# Altium footprint library Connectors.PcbLib: 268 footprints (part 4 of 21) (continued)
## CN_VME64_160pin [mm] "160pin 2.54mm Pitch VME64 compatible DIN41612" (continued)
3D body: height 6.84, standoff 6.24, extent 37.8,-8.5 38.4,7.92
3D body: height 6.84, standoff -3, extent 37.8,7.32 38.4,7.92
3D body: height 9.42, standoff 8.94, extent 37.8,-8 38.4,-2.95
3D body: height 8.94, standoff 8.34, extent 37.8,-2.95 38.4,10.46
3D body: height 8.94, standoff -3, extent 37.8,9.86 38.4,10.46
3D body: height 4.3, standoff -3, extent 37.8,4.78 38.4,5.38
3D body: height 4.3, standoff 3.7, extent 37.8,-8.5 38.4,5.38
3D body: height 0, standoff -3, extent 40.34,-0.3 40.94,0.3
3D body: height 1.76, standoff 1.16, extent 40.34,-8.5 40.94,2.84
3D body: height 1.76, standoff -3, extent 40.34,2.24 40.94,2.84
3D body: height 6.84, standoff 6.24, extent 40.34,-8.5 40.94,7.92
3D body: height 6.84, standoff -3, extent 40.34,7.32 40.94,7.92
3D body: height 9.42, standoff 8.94, extent 40.34,-8 40.94,-2.95
3D body: height 8.94, standoff 8.34, extent 40.34,-2.95 40.94,10.46
3D body: height 8.94, standoff -3, extent 40.34,9.86 40.94,10.46
3D body: height 4.3, standoff -3, extent 40.34,4.78 40.94,5.38
3D body: height 4.3, standoff 3.7, extent 40.34,-8.5 40.94,5.38
3D body: height 0, standoff -3, extent 42.88,-0.3 43.48,0.3
3D body: height 1.76, standoff 1.16, extent 42.88,-8.5 43.48,2.84
3D body: height 1.76, standoff -3, extent 42.88,2.24 43.48,2.84
3D body: height 6.84, standoff 6.24, extent 42.88,-8.5 43.48,7.92
3D body: height 6.84, standoff -3, extent 42.88,7.32 43.48,7.92
3D body: height 9.42, standoff 8.94, extent 42.88,-8 43.48,-2.95
3D body: height 8.94, standoff 8.34, extent 42.88,-2.95 43.48,10.46
3D body: height 8.94, standoff -3, extent 42.88,9.86 43.48,10.46
3D body: height 4.3, standoff -3, extent 42.88,4.78 43.48,5.38
3D body: height 4.3, standoff 3.7, extent 42.88,-8.5 43.48,5.38
3D body: height 0, standoff -3, extent 45.42,-0.3 46.02,0.3
3D body: height 1.76, standoff 1.16, extent 45.42,-8.5 46.02,2.84
3D body: height 1.76, standoff -3, extent 45.42,2.24 46.02,2.84
3D body: height 6.84, standoff 6.24, extent 45.42,-8.5 46.02,7.92
3D body: height 6.84, standoff -3, extent 45.42,7.32 46.02,7.92
3D body: height 9.42, standoff 8.94, extent 45.42,-8 46.02,-2.95
3D body: height 8.94, standoff 8.34, extent 45.42,-2.95 46.02,10.46
3D body: height 8.94, standoff -3, extent 45.42,9.86 46.02,10.46
3D body: height 4.3, standoff -3, extent 45.42,4.78 46.02,5.38
3D body: height 4.3, standoff 3.7, extent 45.42,-8.5 46.02,5.38
3D body: height 0, standoff -3, extent 47.96,-0.3 48.56,0.3
3D body: height 1.76, standoff 1.16, extent 47.96,-8.5 48.56,2.84
3D body: height 1.76, standoff -3, extent 47.96,2.24 48.56,2.84
3D body: height 6.84, standoff 6.24, extent 47.96,-8.5 48.56,7.92
3D body: height 6.84, standoff -3, extent 47.96,7.32 48.56,7.92
3D body: height 9.42, standoff 8.94, extent 47.96,-8 48.56,-2.95
3D body: height 8.94, standoff 8.34, extent 47.96,-2.95 48.56,10.46
3D body: height 8.94, standoff -3, extent 47.96,9.86 48.56,10.46
3D body: height 4.3, standoff -3, extent 47.96,4.78 48.56,5.38
3D body: height 4.3, standoff 3.7, extent 47.96,-8.5 48.56,5.38
3D body: height 0, standoff -3, extent 50.5,-0.3 51.1,0.3
3D body: height 1.76, standoff 1.16, extent 50.5,-8.5 51.1,2.84
3D body: height 1.76, standoff -3, extent 50.5,2.24 51.1,2.84
3D body: height 6.84, standoff 6.24, extent 50.5,-8.5 51.1,7.92
3D body: height 6.84, standoff -3, extent 50.5,7.32 51.1,7.92
3D body: height 9.42, standoff 8.94, extent 50.5,-8 51.1,-2.95
3D body: height 8.94, standoff 8.34, extent 50.5,-2.95 51.1,10.46
3D body: height 8.94, standoff -3, extent 50.5,9.86 51.1,10.46
3D body: height 4.3, standoff -3, extent 50.5,4.78 51.1,5.38
3D body: height 4.3, standoff 3.7, extent 50.5,-8.5 51.1,5.38
3D body: height 0, standoff -3, extent 53.04,-0.3 53.64,0.3
3D body: height 1.76, standoff 1.16, extent 53.04,-8.5 53.64,2.84
3D body: height 1.76, standoff -3, extent 53.04,2.24 53.64,2.84
3D body: height 6.84, standoff 6.24, extent 53.04,-8.5 53.64,7.92
3D body: height 6.84, standoff -3, extent 53.04,7.32 53.64,7.92
3D body: height 9.42, standoff 8.94, extent 53.04,-8 53.64,-2.95
3D body: height 8.94, standoff 8.34, extent 53.04,-2.95 53.64,10.46
3D body: height 8.94, standoff -3, extent 53.04,9.86 53.64,10.46
3D body: height 4.3, standoff -3, extent 53.04,4.78 53.64,5.38
3D body: height 4.3, standoff 3.7, extent 53.04,-8.5 53.64,5.38
3D body: height 0, standoff -3, extent 55.58,-0.3 56.18,0.3
3D body: height 1.76, standoff 1.16, extent 55.58,-8.5 56.18,2.84
3D body: height 1.76, standoff -3, extent 55.58,2.24 56.18,2.84
3D body: height 6.84, standoff 6.24, extent 55.58,-8.5 56.18,7.92
3D body: height 6.84, standoff -3, extent 55.58,7.32 56.18,7.92
3D body: height 9.42, standoff 8.94, extent 55.58,-8 56.18,-2.95
3D body: height 8.94, standoff 8.34, extent 55.58,-2.95 56.18,10.46
3D body: height 8.94, standoff -3, extent 55.58,9.86 56.18,10.46
3D body: height 4.3, standoff -3, extent 55.58,4.78 56.18,5.38
3D body: height 4.3, standoff 3.7, extent 55.58,-8.5 56.18,5.38
3D body: height 0, standoff -3, extent 58.12,-0.3 58.72,0.3
3D body: height 1.76, standoff 1.16, extent 58.12,-8.5 58.72,2.84
3D body: height 1.76, standoff -3, extent 58.12,2.24 58.72,2.84
3D body: height 6.84, standoff 6.24, extent 58.12,-8.5 58.72,7.92
3D body: height 6.84, standoff -3, extent 58.12,7.32 58.72,7.92
3D body: height 9.42, standoff 8.94, extent 58.12,-8 58.72,-2.95
3D body: height 8.94, standoff 8.34, extent 58.12,-2.95 58.72,10.46
3D body: height 8.94, standoff -3, extent 58.12,9.86 58.72,10.46
3D body: height 4.3, standoff -3, extent 58.12,4.78 58.72,5.38
3D body: height 4.3, standoff 3.7, extent 58.12,-8.5 58.72,5.38
3D body: height 0, standoff -3, extent 60.66,-0.3 61.26,0.3
3D body: height 1.76, standoff 1.16, extent 60.66,-8.5 61.26,2.84
3D body: height 1.76, standoff -3, extent 60.66,2.24 61.26,2.84
3D body: height 6.84, standoff 6.24, extent 60.66,-8.5 61.26,7.92
3D body: height 6.84, standoff -3, extent 60.66,7.32 61.26,7.92
3D body: height 9.42, standoff 8.94, extent 60.66,-8 61.26,-2.95
3D body: height 8.94, standoff 8.34, extent 60.66,-2.95 61.26,10.46
3D body: height 8.94, standoff -3, extent 60.66,9.86 61.26,10.46
3D body: height 4.3, standoff -3, extent 60.66,4.78 61.26,5.38
3D body: height 4.3, standoff 3.7, extent 60.66,-8.5 61.26,5.38
3D body: height 0, standoff -3, extent 63.2,-0.3 63.8,0.3
3D body: height 1.76, standoff 1.16, extent 63.2,-8.5 63.8,2.84
3D body: height 1.76, standoff -3, extent 63.2,2.24 63.8,2.84
3D body: height 6.84, standoff 6.24, extent 63.2,-8.5 63.8,7.92
3D body: height 6.84, standoff -3, extent 63.2,7.32 63.8,7.92
3D body: height 9.42, standoff 8.94, extent 63.2,-8 63.8,-2.95
3D body: height 8.94, standoff 8.34, extent 63.2,-2.95 63.8,10.46
3D body: height 8.94, standoff -3, extent 63.2,9.86 63.8,10.46
3D body: height 4.3, standoff -3, extent 63.2,4.78 63.8,5.38
3D body: height 4.3, standoff 3.7, extent 63.2,-8.5 63.8,5.38
3D body: height 0, standoff -3, extent 65.74,-0.3 66.34,0.3
3D body: height 1.76, standoff 1.16, extent 65.74,-8.5 66.34,2.84
3D body: height 1.76, standoff -3, extent 65.74,2.24 66.34,2.84
3D body: height 6.84, standoff 6.24, extent 65.74,-8.5 66.34,7.92
3D body: height 6.84, standoff -3, extent 65.74,7.32 66.34,7.92
3D body: height 9.42, standoff 8.94, extent 65.74,-8 66.34,-2.95
3D body: height 8.94, standoff 8.34, extent 65.74,-2.95 66.34,10.46
3D body: height 8.94, standoff -3, extent 65.74,9.86 66.34,10.46
3D body: height 4.3, standoff -3, extent 65.74,4.78 66.34,5.38
3D body: height 4.3, standoff 3.7, extent 65.74,-8.5 66.34,5.38
3D body: height 0, standoff -3, extent 68.28,-0.3 68.88,0.3
3D body: height 1.76, standoff 1.16, extent 68.28,-8.5 68.88,2.84
3D body: height 1.76, standoff -3, extent 68.28,2.24 68.88,2.84
3D body: height 6.84, standoff 6.24, extent 68.28,-8.5 68.88,7.92
3D body: height 6.84, standoff -3, extent 68.28,7.32 68.88,7.92
3D body: height 9.42, standoff 8.94, extent 68.28,-8 68.88,-2.95
3D body: height 8.94, standoff 8.34, extent 68.28,-2.95 68.88,10.46
3D body: height 8.94, standoff -3, extent 68.28,9.86 68.88,10.46
3D body: height 4.3, standoff -3, extent 68.28,4.78 68.88,5.38
3D body: height 4.3, standoff 3.7, extent 68.28,-8.5 68.88,5.38
3D body: height 0, standoff -3, extent 70.82,-0.3 71.42,0.3
3D body: height 1.76, standoff 1.16, extent 70.82,-8.5 71.42,2.84
3D body: height 1.76, standoff -3, extent 70.82,2.24 71.42,2.84
3D body: height 6.84, standoff 6.24, extent 70.82,-8.5 71.42,7.92
3D body: height 6.84, standoff -3, extent 70.82,7.32 71.42,7.92
3D body: height 9.42, standoff 8.94, extent 70.82,-8 71.42,-2.95
3D body: height 8.94, standoff 8.34, extent 70.82,-2.95 71.42,10.46
3D body: height 8.94, standoff -3, extent 70.82,9.86 71.42,10.46
3D body: height 4.3, standoff -3, extent 70.82,4.78 71.42,5.38
3D body: height 4.3, standoff 3.7, extent 70.82,-8.5 71.42,5.38
3D body: height 0, standoff -3, extent 73.36,-0.3 73.96,0.3
3D body: height 1.76, standoff 1.16, extent 73.36,-8.5 73.96,2.84
3D body: height 1.76, standoff -3, extent 73.36,2.24 73.96,2.84
3D body: height 6.84, standoff 6.24, extent 73.36,-8.5 73.96,7.92
3D body: height 6.84, standoff -3, extent 73.36,7.32 73.96,7.92
3D body: height 9.42, standoff 8.94, extent 73.36,-8 73.96,-2.95
3D body: height 8.94, standoff 8.34, extent 73.36,-2.95 73.96,10.46
3D body: height 8.94, standoff -3, extent 73.36,9.86 73.96,10.46
3D body: height 4.3, standoff -3, extent 73.36,4.78 73.96,5.38
3D body: height 4.3, standoff 3.7, extent 73.36,-8.5 73.96,5.38
3D body: height 0, standoff -3, extent 75.9,-0.3 76.5,0.3
3D body: height 1.76, standoff 1.16, extent 75.9,-8.5 76.5,2.84
3D body: height 1.76, standoff -3, extent 75.9,2.24 76.5,2.84
3D body: height 6.84, standoff 6.24, extent 75.9,-8.5 76.5,7.92
3D body: height 6.84, standoff -3, extent 75.9,7.32 76.5,7.92
3D body: height 9.42, standoff 8.94, extent 75.9,-8 76.5,-2.95
3D body: height 8.94, standoff 8.34, extent 75.9,-2.95 76.5,10.46
3D body: height 8.94, standoff -3, extent 75.9,9.86 76.5,10.46
3D body: height 4.3, standoff -3, extent 75.9,4.78 76.5,5.38
3D body: height 4.3, standoff 3.7, extent 75.9,-8.5 76.5,5.38
3D body: height 0, standoff -3, extent 78.44,-0.3 79.04,0.3
3D body: height 1.76, standoff 1.16, extent 78.44,-8.5 79.04,2.84
3D body: height 1.76, standoff -3, extent 78.44,2.24 79.04,2.84
3D body: height 6.84, standoff 6.24, extent 78.44,-8.5 79.04,7.92
3D body: height 6.84, standoff -3, extent 78.44,7.32 79.04,7.92
3D body: height 9.42, standoff 8.94, extent 78.44,-8 79.04,-2.95
3D body: height 8.94, standoff 8.34, extent 78.44,-2.95 79.04,10.46
3D body: height 8.94, standoff -3, extent 78.44,9.86 79.04,10.46
3D body: height 4.3, standoff -3, extent 78.44,4.78 79.04,5.38
3D body: height 4.3, standoff 3.7, extent 78.44,-8.5 79.04,5.38
3D body: height 6, standoff 0, extent 80.87,-5.101 83.841,2.9
3D body: height 6, standoff 0, extent 83.839,-5.101 86.37,2.9
3D body: height 6, standoff 0, extent -7.63,-5.101 -5.099,2.9
3D body: height 6, standoff 0, extent -5.101,-5.101 -2.13,2.9

## CN_VME64_160pin_F [mm] "160pin 2.54mm Pitch VME64 compatible DIN41612 Female"
height 10.65
pads (162):
  rect 1.5x1.5 hole 1: A1(78.74,-2.54)
  round 1.5 hole 1: A2(76.2,-2.54) A3(73.66,-2.54) A4(71.12,-2.54) A5(68.58,-2.54) A6(66.04,-2.54) A7(63.5,-2.54) A8(60.96,-2.54) A9(58.42,-2.54) A10(55.88,-2.54) A11(53.34,-2.54) A12(50.8,-2.54) A13(48.26,-2.54) A14(45.72,-2.54) A15(43.18,-2.54) A16(40.64,-2.54) A17(38.1,-2.54) A18(35.56,-2.54) A19(33.02,-2.54) A20(30.48,-2.54) A21(27.94,-2.54) A22(25.4,-2.54) A23(22.86,-2.54) A24(20.32,-2.54) A25(17.78,-2.54) A26(15.24,-2.54) A27(12.7,-2.54) A28(10.16,-2.54) A29(7.62,-2.54) A30(5.08,-2.54) A31(2.54,-2.54) A32(0,-2.54) B1(78.74,-5.08) B2(76.2,-5.08) B3(73.66,-5.08) B4(71.12,-5.08) B5(68.58,-5.08) B6(66.04,-5.08) B7(63.5,-5.08) B8(60.96,-5.08) B9(58.42,-5.08) B10(55.88,-5.08) B11(53.34,-5.08) B12(50.8,-5.08) B13(48.26,-5.08) B14(45.72,-5.08) B15(43.18,-5.08) B16(40.64,-5.08) B17(38.1,-5.08) B18(35.56,-5.08) B19(33.02,-5.08) B20(30.48,-5.08) B21(27.94,-5.08) B22(25.4,-5.08) B23(22.86,-5.08) B24(20.32,-5.08) B25(17.78,-5.08) B26(15.24,-5.08) B27(12.7,-5.08) B28(10.16,-5.08) B29(7.62,-5.08) B30(5.08,-5.08) B31(2.54,-5.08) B32(0,-5.08) C1(78.74,-7.62) C2(76.2,-7.62) C3(73.66,-7.62) C4(71.12,-7.62) C5(68.58,-7.62) C6(66.04,-7.62) C7(63.5,-7.62) C8(60.96,-7.62) C9(58.42,-7.62) C10(55.88,-7.62) C11(53.34,-7.62) C12(50.8,-7.62) C13(48.26,-7.62) C14(45.72,-7.62) C15(43.18,-7.62) C16(40.64,-7.62) C17(38.1,-7.62) C18(35.56,-7.62) C19(33.02,-7.62) C20(30.48,-7.62) C21(27.94,-7.62) C22(25.4,-7.62) C23(22.86,-7.62) C24(20.32,-7.62) C25(17.78,-7.62) C26(15.24,-7.62) C27(12.7,-7.62) C28(10.16,-7.62) C29(7.62,-7.62) C30(5.08,-7.62) C31(2.54,-7.62) C32(0,-7.62) D1(78.74,-10.16) D2(76.2,-10.16) D3(73.66,-10.16) D4(71.12,-10.16) D5(68.58,-10.16) D6(66.04,-10.16) D7(63.5,-10.16) D8(60.96,-10.16) D9(58.42,-10.16) D10(55.88,-10.16) D11(53.34,-10.16) D12(50.8,-10.16) D13(48.26,-10.16) D14(45.72,-10.16) D15(43.18,-10.16) D16(40.64,-10.16) D17(38.1,-10.16) D18(35.56,-10.16) D19(33.02,-10.16) D20(30.48,-10.16) D21(27.94,-10.16) D22(25.4,-10.16) D23(22.86,-10.16) D24(20.32,-10.16) D25(17.78,-10.16) D26(15.24,-10.16) D27(12.7,-10.16) D28(10.16,-10.16) D29(7.62,-10.16) D30(5.08,-10.16) D31(2.54,-10.16) D32(0,-10.16) Z1(78.74,0) Z2(76.2,0) Z3(73.66,0) Z4(71.12,0) Z5(68.58,0) Z6(66.04,0) Z7(63.5,0) Z8(60.96,0) Z9(58.42,0) Z10(55.88,0) Z11(53.34,0) Z12(50.8,0) Z13(48.26,0) Z14(45.72,0) Z15(43.18,0) Z16(40.64,0) Z17(38.1,0) Z18(35.56,0) Z19(33.02,0) Z20(30.48,0) Z21(27.94,0) Z22(25.4,0) Z23(22.86,0) Z24(20.32,0) Z25(17.78,0) Z26(15.24,0) Z27(12.7,0) Z28(10.16,0) Z29(7.62,0) Z30(5.08,0) Z31(2.54,0) Z32(0,0)
  round 2.5 hole 2.8 unplated: MH1(-5.08,0) MH2(83.82,0)
Top Overlay:
  text "32" at -4.55,-10.85 h1.5
  text "1" at 81.3,-10.95 h1.5
Mechanical 13:
  lines w0.1: -7.53,-6.4 -7.53,2.76 -7.53,12.6 86.27,12.6 86.27,2.76 86.27,-6.4 80.265,-6.4 80.265,-12.3 -1.525,-12.3 -1.525,-6.4 -7.53,-6.4
Mechanical 15:
  lines w0.1: -15.26,2.76 93.99,2.76 ; -7.88,2.76 -7.88,-3.18 -1.05,-3.18 -1.05,-11.21 79.79,-11.21 79.79,-3.18 86.62,-3.18 ; 78.24,-2.54 79.24,-2.54 ; 78.74,-3.04 78.74,-2.04 ; 86.61,-3.18 86.61,2.76
  text "Board Edge" at -20.15,0.75 h1.5
3D body "02042102020_100070274MOD000B.STP": height 10.71, standoff -2.94, extent -7.53,-12.3 86.277,12.6

## CN_VME64_160pin_F_RFC [mm] "160pin 2.54mm Pitch VME64 compatible DIN41612 Female Inverted pins for RFC"
height 10.65
pads (162):
  rect 1.5x1.5 hole 1: A1(0,-2.54)
  round 1.5 hole 1: A2(2.54,-2.54) A3(5.08,-2.54) A4(7.62,-2.54) A5(10.16,-2.54) A6(12.7,-2.54) A7(15.24,-2.54) A8(17.78,-2.54) A9(20.32,-2.54) A10(22.86,-2.54) A11(25.4,-2.54) A12(27.94,-2.54) A13(30.48,-2.54) A14(33.02,-2.54) A15(35.56,-2.54) A16(38.1,-2.54) A17(40.64,-2.54) A18(43.18,-2.54) A19(45.72,-2.54) A20(48.26,-2.54) A21(50.8,-2.54) A22(53.34,-2.54) A23(55.88,-2.54) A24(58.42,-2.54) A25(60.96,-2.54) A26(63.5,-2.54) A27(66.04,-2.54) A28(68.58,-2.54) A29(71.12,-2.54) A30(73.66,-2.54) A31(76.2,-2.54) A32(78.74,-2.54) B1(0,-5.08) B2(2.54,-5.08) B3(5.08,-5.08) B4(7.62,-5.08) B5(10.16,-5.08) B6(12.7,-5.08) B7(15.24,-5.08) B8(17.78,-5.08) B9(20.32,-5.08) B10(22.86,-5.08) B11(25.4,-5.08) B12(27.94,-5.08) B13(30.48,-5.08) B14(33.02,-5.08) B15(35.56,-5.08) B16(38.1,-5.08) B17(40.64,-5.08) B18(43.18,-5.08) B19(45.72,-5.08) B20(48.26,-5.08) B21(50.8,-5.08) B22(53.34,-5.08) B23(55.88,-5.08) B24(58.42,-5.08) B25(60.96,-5.08) B26(63.5,-5.08) B27(66.04,-5.08) B28(68.58,-5.08) B29(71.12,-5.08) B30(73.66,-5.08) B31(76.2,-5.08) B32(78.74,-5.08) C1(0,-7.62) C2(2.54,-7.62) C3(5.08,-7.62) C4(7.62,-7.62) C5(10.16,-7.62) C6(12.7,-7.62) C7(15.24,-7.62) C8(17.78,-7.62) C9(20.32,-7.62) C10(22.86,-7.62) C11(25.4,-7.62) C12(27.94,-7.62) C13(30.48,-7.62) C14(33.02,-7.62) C15(35.56,-7.62) C16(38.1,-7.62) C17(40.64,-7.62) C18(43.18,-7.62) C19(45.72,-7.62) C20(48.26,-7.62) C21(50.8,-7.62) C22(53.34,-7.62) C23(55.88,-7.62) C24(58.42,-7.62) C25(60.96,-7.62) C26(63.5,-7.62) C27(66.04,-7.62) C28(68.58,-7.62) C29(71.12,-7.62) C30(73.66,-7.62) C31(76.2,-7.62) C32(78.74,-7.62) D1(0,-10.16) D2(2.54,-10.16) D3(5.08,-10.16) D4(7.62,-10.16) D5(10.16,-10.16) D6(12.7,-10.16) D7(15.24,-10.16) D8(17.78,-10.16) D9(20.32,-10.16) D10(22.86,-10.16) D11(25.4,-10.16) D12(27.94,-10.16) D13(30.48,-10.16) D14(33.02,-10.16) D15(35.56,-10.16) D16(38.1,-10.16) D17(40.64,-10.16) D18(43.18,-10.16) D19(45.72,-10.16) D20(48.26,-10.16) D21(50.8,-10.16) D22(53.34,-10.16) D23(55.88,-10.16) D24(58.42,-10.16) D25(60.96,-10.16) D26(63.5,-10.16) D27(66.04,-10.16) D28(68.58,-10.16) D29(71.12,-10.16) D30(73.66,-10.16) D31(76.2,-10.16) D32(78.74,-10.16) Z1(0,0) Z2(2.54,0) Z3(5.08,0) Z4(7.62,0) Z5(10.16,0) Z6(12.7,0) Z7(15.24,0) Z8(17.78,0) Z9(20.32,0) Z10(22.86,0) Z11(25.4,0) Z12(27.94,0) Z13(30.48,0) Z14(33.02,0) Z15(35.56,0) Z16(38.1,0) Z17(40.64,0) Z18(43.18,0) Z19(45.72,0) Z20(48.26,0) Z21(50.8,0) Z22(53.34,0) Z23(55.88,0) Z24(58.42,0) Z25(60.96,0) Z26(63.5,0) Z27(66.04,0) Z28(68.58,0) Z29(71.12,0) Z30(73.66,0) Z31(76.2,0) Z32(78.74,0)
  round 2.5 hole 2.8 unplated: MH1(-5.08,0) MH2(83.82,0)
Top Overlay:
  text "32" at -4.55,-10.85 h1.5
  text "1" at 81.3,-10.95 h1.5
Mechanical 13:
  lines w0.1: -7.53,-6.4 -7.53,2.76 -7.53,12.6 86.27,12.6 86.27,2.76 86.27,-6.4 80.265,-6.4 80.265,-12.3 -1.525,-12.3 -1.525,-6.4 -7.53,-6.4
Mechanical 15:
  lines w0.1: -15.26,2.76 93.99,2.76 ; -7.88,2.76 -7.88,-3.18 -1.05,-3.18 -1.05,-11.21 79.79,-11.21 79.79,-3.18 86.62,-3.18 ; -0.5,-2.54 0.5,-2.54 ; 0,-3.04 0,-2.04 ; 86.61,-3.18 86.61,2.76
  text "Board Edge" at -20.15,0.75 h1.5
3D body "02042102020_100070274MOD000B.STP": height 10.71, standoff -2.94, extent -7.53,-12.3 86.277,12.6

## CNAMC170FATCA [mm] "AMC ATCA 170 pin horizontal"
height 12.9
pads (178):
  oval 0.48x0.75 smd paste-1: 1(31.5,-1.2) 2(30.75,0) 3(30,0) 4(29.25,-1.2) 5(28.5,0) 6(27.75,0) 7(27,-1.2) 8(26.25,0) 9(25.5,0) 10(24.75,-1.2) 11(24,0) 12(23.25,0) 13(22.5,-1.2) 14(21.75,0) 15(21,0) 16(20.25,-1.2) 17(19.5,0) 18(18.75,0) 19(18,-1.2) 20(17.25,0) 21(16.5,0) 22(15.75,-1.2) 23(15,0) 24(14.25,0) 25(13.5,-1.2) 26(12.75,0) 27(12,0) 28(11.25,-1.2) 29(10.5,0) 30(9.75,0) 31(9,-1.2) 32(8.25,0) 33(7.5,0) 34(6.75,-1.2) 35(6.05,0) 36(5.25,0) 37(4.5,-1.2) 38(3.75,0) 39(3,0) 40(2.25,-1.2) 41(1.5,0) 42(0.75,0) 43(0,-1.2) 44(-0.75,0) 45(-1.5,0) 46(-2.25,-1.2) 47(-3,0) 48(-3.75,0) 49(-4.5,-1.2) 50(-5.25,0) 51(-6,0) 52(-6.75,-1.2) 53(-7.5,0) 54(-8.25,0) 55(-9,-1.2) 56(-9.75,0) 57(-10.5,0) 58(-11.25,-1.2) 59(-12,0) 60(-12.75,0) 61(-13.5,-1.2) 62(-14.25,0) 63(-15,0) 64(-15.75,-1.2) 65(-16.5,0) 66(-17.25,0) 67(-18,-1.2) 68(-18.75,0) 69(-19.5,0) 70(-20.25,-1.2) 71(-21,0) 72(-21.75,0) 73(-22.5,-1.2) 74(-23.25,0) 75(-24,0) 76(-24.75,-1.2) 77(-25.45,0) 78(-26.25,0) 79(-27,-1.2) 80(-27.75,0) 81(-28.5,0) 82(-29.25,-1.2) 83(-30,0) 84(-30.75,0) 85(-31.5,-1.2) 86(-31.5,3.8) 87(-30.75,5) 88(-30,5) 89(-29.25,3.8) 90(-28.5,5) 91(-27.75,5) 92(-27,3.8) 93(-26.25,5) 94(-25.5,5) 95(-24.75,3.8) 96(-24,5) 97(-23.25,5) 98(-22.5,3.8) 99(-21.75,5) 100(-21,5) 101(-20.25,3.8) 102(-19.5,5) 103(-18.75,5) 104(-18,3.8) 105(-17.25,5) 106(-16.5,5) 107(-15.75,3.8) 108(-15,5) 109(-14.25,5) 110(-13.5,3.8) 111(-12.75,5) 112(-12,5) 113(-11.25,3.8) 114(-10.5,5) 115(-9.75,5) 116(-9,3.8) 117(-8.25,5) 118(-7.5,5) 119(-6.75,3.8) 120(-6,5) 121(-5.25,5) 122(-4.5,3.8) 123(-3.75,5) 124(-3,5) 125(-2.25,3.8) 126(-1.5,5) 127(-0.75,5) 128(-0.025,3.8) 129(0.75,5) 130(1.5,5) 131(2.25,3.8) 132(3,5) 133(3.75,5) 134(4.5,3.8) 135(5.25,5) 136(6,5) 137(6.75,3.8) 138(7.5,5) 139(8.25,5) 140(9,3.8) 141(9.75,5) 142(10.5,5) 143(11.25,3.8) 144(12,5) 145(12.75,5) 146(13.5,3.8) 147(14.25,5) 148(15,5) 149(15.75,3.8) 150(16.5,5) 151(17.25,5) 152(18,3.8) 153(18.75,5) 154(19.5,5) 155(20.25,3.8) 156(21,5) 157(21.75,5) 158(22.5,3.8) 159(23.25,5) 160(24,5) 161(24.75,3.8) 162(25.5,5) 163(26.25,5) 164(27,3.8) 165(27.75,5) 166(28.5,5) 167(29.25,3.8) 168(30,5) 169(30.75,5) 170(31.5,3.8)
  round 0 hole 1.5 unplated mask+0.2: MH1(-32.5,0) MH2(32.5,0) MH3(-32.5,5) MH4(32.5,5)
  round 0 hole 2.7 unplated mask+0.2: MH5(-35.15,2) MH6(35.15,2)
  round 0 hole 7 unplated mask+0.3: MH7(37.5,6.9) MH8(-37.5,6.9)
Mechanical 13:
  circle w0.1: c-35.75,-3 r1.2
  circle w0.1: c35.75,-3 r1.2
  lines w0.1: -37.401,3.652 ccw(c-37.5,6.9) -37.4,10.148 ; -37.4,5.55 -37.4,-7 37.4,-7 37.4,5.55 ; -37.4,5.554 ccw(c-37.5,6.9) -37.4,8.246 ; -37.4,8.25 -37.4,10.15 ; -34.3,6.3 34.3,6.3 ; 37.4,3.652 cw(c37.5,6.9) 37.4,10.148 ; 37.4,5.554 cw(c37.5,6.9) 37.4,8.246 ; 37.4,8.25 37.4,10.15
Mechanical 15:
  lines w0.1: -32.5,-7 -32.5,-0.1 32.5,-0.1 32.5,-7
  text "DAUGHTER BOARD" at -5.95,-1.3 h0.8
3D body: height 22.5, standoff 21.85, extent 34.55,-4.2 36.95,-1.8
3D body: height 8.25, standoff -5.8, extent -37.4,3.675 -34.25,10.148
3D body: height 17, standoff 0, extent -37.401,-7 37.4,6.3
3D body: height 8.25, standoff -5.8, extent 34.25,3.679 37.401,10.152
3D body: height 22.5, standoff 21.85, extent -36.95,-4.2 -34.55,-1.8
3D body: height 18.9, standoff 17, extent -37.401,-7 37.4,6.3
3D body: height 21.85, standoff 18.9, extent -37.401,-7 37.4,6.3

## CNAMC170FUTCA [mm] "AMC uTCA 170 pin vertical"
height 12.9
pads (174):
  oval 0.48x0.75 smd paste-1: 1(31.5,-3.05) 2(30.75,-1.85) 3(30,-1.85) 4(29.25,-3.05) 5(28.5,-1.85) 6(27.75,-1.85) 7(27,-3.05) 8(26.25,-1.85) 9(25.5,-1.85) 10(24.75,-3.05) 11(24,-1.85) 12(23.25,-1.85) 13(22.5,-3.05) 14(21.75,-1.85) 15(21,-1.85) 16(20.25,-3.05) 17(19.5,-1.85) 18(18.75,-1.85) 19(18,-3.05) 20(17.25,-1.85) 21(16.5,-1.85) 22(15.75,-3.05) 23(15,-1.85) 24(14.25,-1.85) 25(13.5,-3.05) 26(12.75,-1.85) 27(12,-1.85) 28(11.25,-3.05) 29(10.5,-1.85) 30(9.75,-1.85) 31(9,-3.05) 32(8.25,-1.85) 33(7.5,-1.85) 34(6.75,-3.05) 35(6.05,-1.85) 36(5.25,-1.85) 37(4.5,-3.05) 38(3.75,-1.85) 39(3,-1.85) 40(2.25,-3.05) 41(1.5,-1.85) 42(0.75,-1.85) 43(0,-3.05) 44(-0.75,-1.85) 45(-1.5,-1.85) 46(-2.25,-3.05) 47(-3,-1.85) 48(-3.75,-1.85) 49(-4.5,-3.05) 50(-5.25,-1.85) 51(-6,-1.85) 52(-6.75,-3.05) 53(-7.5,-1.85) 54(-8.25,-1.85) 55(-9,-3.05) 56(-9.75,-1.85) 57(-10.5,-1.85) 58(-11.25,-3.05) 59(-12,-1.85) 60(-12.75,-1.85) 61(-13.5,-3.05) 62(-14.25,-1.85) 63(-15,-1.85) 64(-15.75,-3.05) 65(-16.5,-1.85) 66(-17.25,-1.85) 67(-18,-3.05) 68(-18.75,-1.85) 69(-19.5,-1.85) 70(-20.25,-3.05) 71(-21,-1.85) 72(-21.75,-1.85) 73(-22.5,-3.05) 74(-23.25,-1.85) 75(-24,-1.85) 76(-24.75,-3.05) 77(-25.45,-1.85) 78(-26.25,-1.85) 79(-27,-3.05) 80(-27.75,-1.85) 81(-28.5,-1.85) 82(-29.25,-3.05) 83(-30,-1.85) 84(-30.75,-1.85) 85(-31.5,-3.05) 86(-31.5,3.05) 87(-30.75,1.85) 88(-30,1.85) 89(-29.25,3.05) 90(-28.5,1.85) 91(-27.75,1.85) 92(-27,3.05) 93(-26.25,1.85) 94(-25.5,1.85) 95(-24.75,3.05) 96(-24,1.85) 97(-23.25,1.85) 98(-22.5,3.05) 99(-21.75,1.85) 100(-21,1.85) 101(-20.25,3.05) 102(-19.5,1.85) 103(-18.75,1.85) 104(-18,3.05) 105(-17.25,1.85) 106(-16.5,1.85) 107(-15.75,3.05) 108(-15,1.85) 109(-14.25,1.85) 110(-13.5,3.05) 111(-12.75,1.85) 112(-12,1.85) 113(-11.25,3.05) 114(-10.5,1.85) 115(-9.75,1.85) 116(-9,3.05) 117(-8.25,1.85) 118(-7.5,1.85) 119(-6.75,3.05) 120(-6,1.85) 121(-5.25,1.85) 122(-4.5,3.05) 123(-3.75,1.85) 124(-3,1.85) 125(-2.25,3.05) 126(-1.5,1.85) 127(-0.75,1.85) 128(0,3.05) 129(0.75,1.85) 130(1.5,1.85) 131(2.25,3.05) 132(3,1.85) 133(3.75,1.85) 134(4.5,3.05) 135(5.25,1.85) 136(6,1.85) 137(6.75,3.05) 138(7.5,1.85) 139(8.25,1.85) 140(9,3.05) 141(9.75,1.85) 142(10.5,1.85) 143(11.25,3.05) 144(12,1.85) 145(12.75,1.85) 146(13.5,3.05) 147(14.25,1.85) 148(15,1.85) 149(15.75,3.05) 150(16.5,1.85) 151(17.25,1.85) 152(18,3.05) 153(18.75,1.85) 154(19.5,1.85) 155(20.25,3.025) 156(21,1.85) 157(21.75,1.85) 158(22.5,3.05) 159(23.25,1.85) 160(24,1.85) 161(24.75,3.05) 162(25.5,1.85) 163(26.25,1.85) 164(27,3.05) 165(27.75,1.85) 166(28.5,1.85) 167(29.25,3.05) 168(30,1.85) 169(30.75,1.85) 170(31.5,3.05)
  round 0 hole 1.8 unplated mask+1: MH1(-35.25,-2.7) MH2(35.25,-2.7)
  round 3.4 hole 2.8: MH3(-35.25,0) MH4(35.25,0)
Mechanical 13:
  lines w0.1: -37.4,-3.75 37.4,-3.75 ; -37.4,3.75 37.4,3.75 ; -33.401,-0.95 33.401,-0.95 33.401,0.95 -33.401,0.95 -33.401,-0.95
  lines w0.102: -37.4,-3.75 -37.4,3.75 ; 37.4,-3.75 37.4,3.75
Mechanical 14:
  lines w0.102: -37.45,-3.75 37.45,-3.75 37.45,3.75 -37.45,3.75 -37.45,-3.75
3D body: height 12.6, standoff 3.5, extent -37.4,-3.75 37.4,0
3D body: height 12.6, standoff 3.5, extent -37.4,0 37.4,3.75
3D body: height 3.5, standoff 0, extent -37.4,-3.75 37.4,3.75
3D body: height 12, standoff 3, extent -33.401,0.686 33.401,0.95
3D body: height 0, standoff -1.44, extent -36.144,-3.581 -34.366,-1.803
3D body: height 0, standoff -1.44, extent 34.356,-3.581 36.134,-1.803
3D body: height 13, standoff -6.8, extent -36.601,-1.346 -33.884,1.346
3D body: height 13, standoff -6.8, extent 33.899,-1.346 36.616,1.346
3D body: height 12, standoff 3, extent -33.401,-0.95 33.401,-0.686
3D body: height -3.3, standoff -6.4, extent -37.45,-3.75 37.45,3.75